# Altium footprint library Intelliclone.PcbLib: 372 footprints (part 24 of 24)
Each footprint in its own frame and in the unit in brackets; x right, y up, seen from the top. Pads: shape width x height; smd on the part's side, far side on the other; paste and mask are expansions set on the pad; w line width, h text height; cw(c..) or ccw(c..) is an arc to the next point about the centre after c.
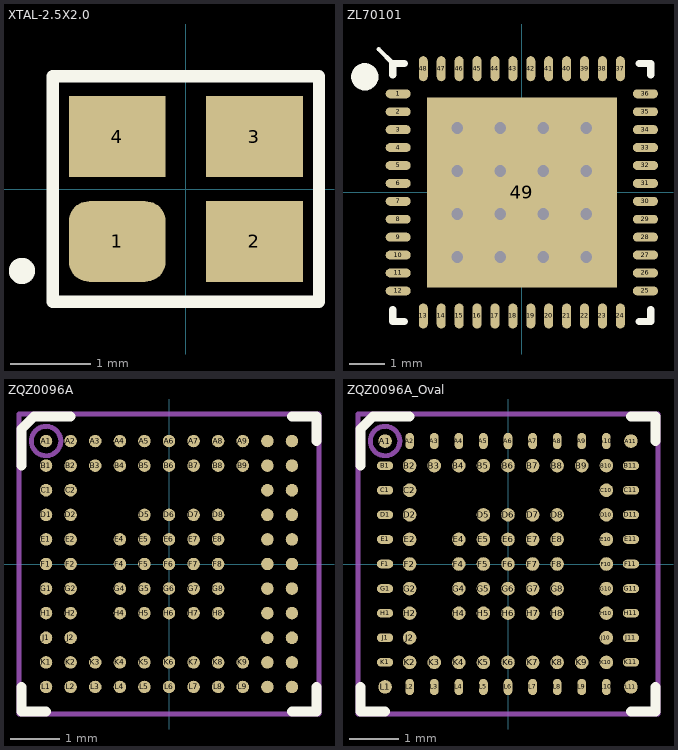
[diagram p23: the footprints below, top view; thin cyan lines are the x and y axes]

## XTAL-2.5X2.0 [mm] "Crystal 2.5mm x 2.0mm"
pads (4):
  rrect50% 1.2x1 smd: 1(-0.85,-0.65)
  rect 1.2x1 smd: 2(0.85,-0.65) 3(0.85,0.65) 4(-0.85,0.65)
Top Overlay:
  circle w0.254: c-2.032,-1.016 r0.036
  lines w0.152: -1.651,-1.397 -1.651,1.397 1.651,1.397 1.651,-1.397 -1.651,-1.397
3D body: height 0.65, standoff 0.1, extent -1.3,-1 1.3,1

## ZL70101 [mm]
pads (49):
  oval 0.7x0.25 smd: 1(-3.45,2.75) 2(-3.45,2.25) 3(-3.45,1.75) 4(-3.45,1.25) 5(-3.45,0.75) 6(-3.45,0.25) 7(-3.45,-0.25) 8(-3.45,-0.75) 9(-3.45,-1.25) 10(-3.45,-1.75) 11(-3.45,-2.25) 12(-3.45,-2.75) 25(3.45,-2.75) 26(3.45,-2.25) 27(3.45,-1.75) 28(3.45,-1.25) 29(3.45,-0.75) 30(3.45,-0.25) 31(3.45,0.25) 32(3.45,0.75) 33(3.45,1.25) 34(3.45,1.75) 35(3.45,2.25) 36(3.45,2.75)
  oval 0.25x0.7 smd: 13(-2.75,-3.45) 14(-2.25,-3.45) 15(-1.75,-3.45) 16(-1.25,-3.45) 17(-0.75,-3.45) 18(-0.25,-3.45) 19(0.25,-3.45) 20(0.75,-3.45) 21(1.25,-3.45) 22(1.75,-3.45) 23(2.25,-3.45) 24(2.75,-3.45) 37(2.75,3.45) 38(2.25,3.45) 39(1.75,3.45) 40(1.25,3.45) 41(0.75,3.45) 42(0.25,3.45) 43(-0.25,3.45) 44(-0.75,3.45) 45(-1.25,3.45) 46(-1.75,3.45) 47(-2.25,3.45) 48(-2.75,3.45)
  rect 5.3x5.3 smd: 49(0,0)
via 1.8,-1.8 diameter 0.686 hole 0.33
via 0.6,-1.8 diameter 0.686 hole 0.33
via -0.6,-1.8 diameter 0.686 hole 0.33
via -1.8,-1.8 diameter 0.686 hole 0.33
via 1.8,-0.6 diameter 0.686 hole 0.33
via 0.6,-0.6 diameter 0.686 hole 0.33
via -0.6,-0.6 diameter 0.686 hole 0.33
via -1.8,-0.6 diameter 0.686 hole 0.33
via 1.8,0.6 diameter 0.686 hole 0.33
via 0.6,0.6 diameter 0.686 hole 0.33
via -0.6,0.6 diameter 0.686 hole 0.33
via -1.8,0.6 diameter 0.686 hole 0.33
via 1.8,1.8 diameter 0.686 hole 0.33
via 0.6,1.8 diameter 0.686 hole 0.33
via -0.6,1.8 diameter 0.686 hole 0.33
via -1.8,1.8 diameter 0.686 hole 0.33
Top Overlay:
  circle w0.381: c-4.381,3.226 r0.191
  lines w0.127: -3.988,3.988 -3.6,3.6
  lines w0.2: -3.6,-3.275 -3.6,-3.6 -3.275,-3.6 ; -3.6,3.275 -3.6,3.6 -3.275,3.6 ; 3.275,-3.6 3.6,-3.6 3.6,-3.275 ; 3.275,3.6 3.6,3.6 3.6,3.275
3D body: height 1, standoff 0, extent -3.575,-3.575 3.575,3.575

## ZQZ0096A [mil] "BGA, 96-Leads, Body 6.0x6.0mm,  Pitch 0.50mm"
height 39.37
pads (96):
  round 10 smd: A1(-98.43,98.43) A2(-78.74,98.43) A3(-59.06,98.43) A4(-39.37,98.43) A5(-19.68,98.43) A6(0,98.43) A7(19.68,98.43) A8(39.37,98.43) A9(59.06,98.43) A10(78.74,98.43) A11(98.43,98.43) B1(-98.43,78.74) B2(-78.74,78.74) B3(-59.06,78.74) B4(-39.37,78.74) B5(-19.68,78.74) B6(0,78.74) B7(19.68,78.74) B8(39.37,78.74) B9(59.06,78.74) B10(78.74,78.74) B11(98.43,78.74) C1(-98.43,59.06) C2(-78.74,59.06) C10(78.74,59.06) C11(98.43,59.06) D1(-98.43,39.37) D2(-78.74,39.37) D5(-19.68,39.37) D6(0,39.37) D7(19.68,39.37) D8(39.37,39.37) D10(78.74,39.37) D11(98.43,39.37) E1(-98.43,19.68) E2(-78.74,19.68) E4(-39.37,19.68) E5(-19.68,19.68) E6(0,19.68) E7(19.68,19.68) E8(39.37,19.68) E10(78.74,19.68) E11(98.43,19.68) F1(-98.43,0) F2(-78.74,0) F4(-39.37,0) F5(-19.68,0) F6(0,0) F7(19.68,0) F8(39.37,0) F10(78.74,0) F11(98.43,0) G1(-98.43,-19.68) G2(-78.74,-19.68) G4(-39.37,-19.68) G5(-19.68,-19.68) G6(0,-19.68) G7(19.68,-19.68) G8(39.37,-19.68) G10(78.74,-19.68) G11(98.43,-19.68) H1(-98.43,-39.37) H2(-78.74,-39.37) H4(-39.37,-39.37) H5(-19.68,-39.37) H6(0,-39.37) H7(19.68,-39.37) H8(39.37,-39.37) H10(78.74,-39.37) H11(98.43,-39.37) J1(-98.43,-59.06) J2(-78.74,-59.06) J10(78.74,-59.06) J11(98.43,-59.06) K1(-98.43,-78.74) K2(-78.74,-78.74) K3(-59.06,-78.74) K4(-39.37,-78.74) K5(-19.68,-78.74) K6(0,-78.74) K7(19.68,-78.74) K8(39.37,-78.74) K9(59.06,-78.74) K10(78.74,-78.74) K11(98.43,-78.74) L1(-98.43,-98.43) L2(-78.74,-98.43) L3(-59.06,-98.43) L4(-39.37,-98.43) L5(-19.68,-98.43) L6(0,-98.43) L7(19.68,-98.43) L8(39.37,-98.43) L9(59.06,-98.43) L10(78.74,-98.43) L11(98.43,-98.43)
Top Overlay:
  lines w7.87: -118.11,-98.43 -118.11,-118.11 -98.43,-118.11 ; -118.11,78.74 -118.11,107.97 -107.97,118.11 -78.74,118.11 ; 98.43,-118.11 118.11,-118.11 118.11,-98.43 ; 98.43,118.11 118.11,118.11 118.11,98.43
Mechanical 5:
  circle w3.94: c-98.43,98.43 r11.81
  lines w3.94: -120.08,-120.08 120.08,-120.08 120.08,120.08 -120.08,120.08 -120.08,-120.08
  text ".Designator" at -62.99,-7.87 h31.5
3D body: height 39.76, standoff 19.68, extent -110.22,86.63 -86.63,110.22
3D body: height 39.37, standoff 0, extent -120.06,-120.06 120.06,120.06

## ZQZ0096A_Oval [mm] "BGA, 96-Leads, Body 6.0x6.0mm,  Pitch 0.50mm"
height 1
pads (96):
  round 0.275 smd: A1(-2.5,2.5) A11(2.5,2.5) B2(-2,2) B3(-1.5,2) B4(-1,2) B5(-0.5,2) B6(0,2) B7(0.5,2) B8(1,2) B9(1.5,2) B10(2,2) C2(-2,1.5) C10(2,1.5) D2(-2,1) D5(-0.5,1) D6(0,1) D7(0.5,1) D8(1,1) D10(2,1) E2(-2,0.5) E4(-1,0.5) E5(-0.5,0.5) E6(0,0.5) E7(0.5,0.5) E8(1,0.5) E10(2,0.5) F2(-2,0) F4(-1,0) F5(-0.5,0) F6(0,0) F7(0.5,0) F8(1,0) F10(2,0) G2(-2,-0.5) G4(-1,-0.5) G5(-0.5,-0.5) G6(0,-0.5) G7(0.5,-0.5) G8(1,-0.5) G10(2,-0.5) H2(-2,-1) H4(-1,-1) H5(-0.5,-1) H6(0,-1) H7(0.5,-1) H8(1,-1) H10(2,-1) J2(-2,-1.5) J10(2,-1.5) K2(-2,-2) K3(-1.5,-2) K4(-1,-2) K5(-0.5,-2) K6(0,-2) K7(0.5,-2) K8(1,-2) K9(1.5,-2) K10(2,-2) L1(-2.5,-2.5) L11(2.5,-2.5)
  oval 0.178x0.33 smd: A2(-2,2.5) A3(-1.5,2.5) A4(-1,2.5) A5(-0.5,2.5) A6(0,2.5) A7(0.5,2.5) A8(1,2.5) A9(1.5,2.5) A10(2,2.5) L2(-2,-2.5) L3(-1.5,-2.5) L4(-1,-2.5) L5(-0.5,-2.5) L6(0,-2.5) L7(0.5,-2.5) L8(1,-2.5) L9(1.5,-2.5) L10(2,-2.5)
  oval 0.33x0.178 smd: B1(-2.5,2) B11(2.5,2) C1(-2.5,1.5) C11(2.5,1.5) D1(-2.5,1) D11(2.5,1) E1(-2.5,0.5) E11(2.5,0.5) F1(-2.5,0) F11(2.5,0) G1(-2.5,-0.5) G11(2.5,-0.5) H1(-2.5,-1) H11(2.5,-1) J1(-2.5,-1.5) J11(2.5,-1.5) K1(-2.5,-2) K11(2.5,-2)
Top Overlay:
  lines w0.2: -3,-2.5 -3,-3 -2.5,-3 ; -3,2 -3,2.742 -2.742,3 -2,3 ; 2.5,-3 3,-3 3,-2.5 ; 2.5,3 3,3 3,2.5
Mechanical 5:
  circle w0.1: c-2.5,2.5 r0.3
  lines w0.1: -3.05,-3.05 -3.05,3.05 3.05,3.05 3.05,-3.05 -3.05,-3.05
  text ".Designator" at -1.6,-0.2 h0.8
3D body: height 1, standoff 0, extent -3.049,-3.049 3.049,3.049
3D body: height 1.01, standoff 0.5, extent -2.799,2.201 -2.201,2.799